# Altium footprint library shared_lib.PcbLib: 65 footprints (part 1 of 5)
Each footprint in its own frame and in the unit in brackets; x right, y up, seen from the top. Pads: shape width x height; smd on the part's side, far side on the other; paste and mask are expansions set on the pad; w line width, h text height; cw(c..) or ccw(c..) is an arc to the next point about the centre after c.
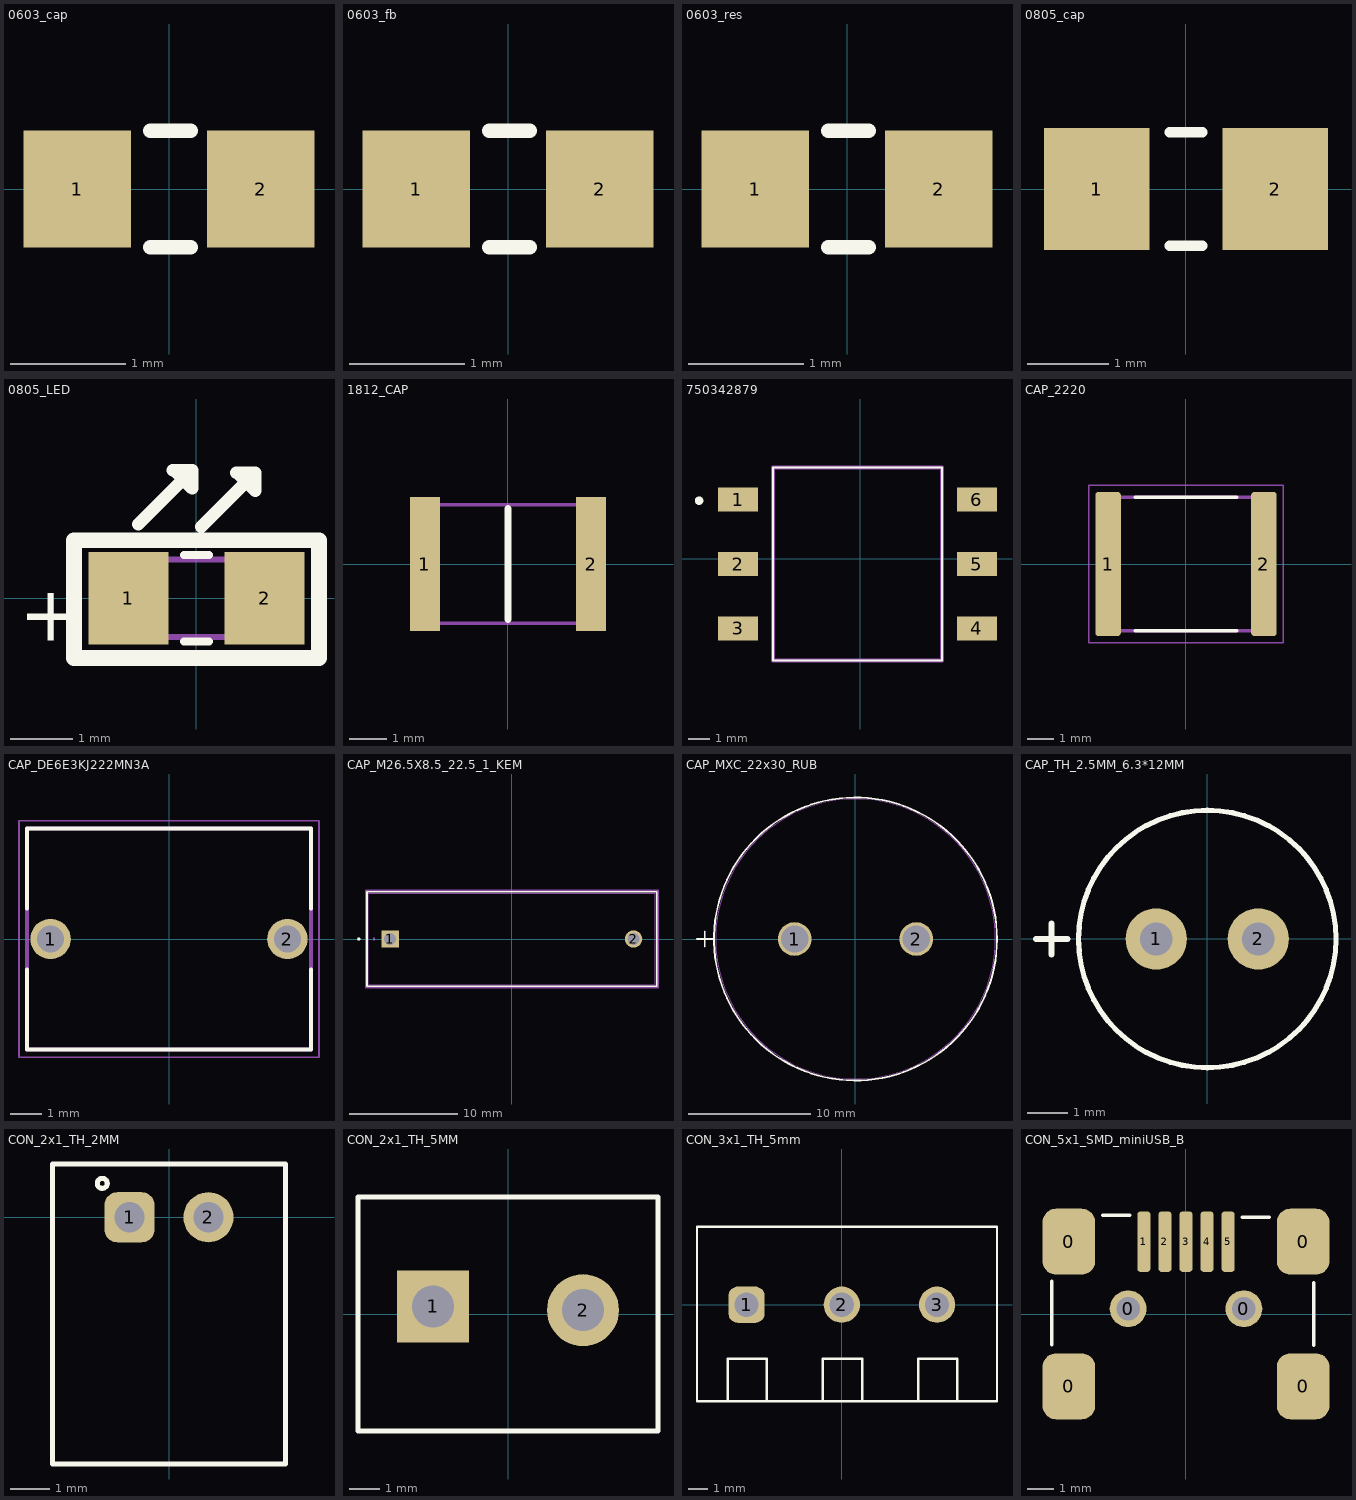
[diagram p0: the footprints below, top view; thin cyan lines are the x and y axes]

## 0603_cap [mil]
pads (2):
  rect 37x40 smd: 1(-31.5,0) 2(31.5,0)
Top Overlay:
  lines w5: -6.5,-20 7.5,-20 ; -6.5,20 7.5,20
3D body "CircuitWorks-CAPACITOR 0603.STEP": height 34.36, standoff 0.5, extent -31.5,-16.93 31.5,16.93

## 0603_fb [mil]
pads (2):
  rect 37x40 smd: 1(-31.5,0) 2(31.5,0)
Top Overlay:
  lines w5: -6.5,-20 7.5,-20 ; -6.5,20 7.5,20
3D body "742792602.stp": height 32, standoff 0.5, extent -31.5,-15.75 31.49,15.75

## 0603_res [mil] "1608 Metric / 20190225 / C-A.Serna.A"
pads (2):
  rect 37x40 smd: 1(-31.5,0) 2(31.5,0)
Top Overlay:
  lines w5: -6.5,-20 7.5,-20 ; -6.5,20 7.5,20
3D body "C0603.step": height 11.89, standoff 0, extent -31.5,-15.75 31.5,15.75

## 0805_cap [mm]
pads (2):
  rect 1.3x1.5 smd: 1(-1.1,0) 2(1.1,0)
Top Overlay:
  lines w0.127: -0.2,-0.7 0.2,-0.7 ; -0.2,0.7 0.2,0.7
3D body: height 1, standoff 0, extent -1.125,-0.7 1.075,0.7

## 0805_LED [mm]
pads (2):
  rect 1.3x1.5 smd: 1(-1.1,0) 2(1.1,0)
Top Overlay:
  lines w0.127: -0.2,-0.7 0.2,-0.7 ; -0.2,0.7 0.2,0.7
  lines w0.203: -0.941,1.197 -0.306,1.832 ; -0.38,2.072 -0.069,2.072 -0.069,1.775 -0.366,2.072 ; 0.079,1.157 0.714,1.792 ; 0.64,2.032 0.951,2.032 0.951,1.735 0.654,2.032
  lines w0.254: -1.981,-0.965 1.981,-0.965 1.981,0.94 -1.981,0.94 -1.981,-0.965
  text "+" at -2.87,-0.686 h0.89
Mechanical 1:
  lines w0.1: -0.7,-0.625 -0.7,0.625 ; 0.7,-0.625 0.7,0.625 ; -1,-0.625 1,-0.625 1,0.625 -1,0.625 -1,-0.625
3D body: height 1.1, standoff 0.5, extent -0.7,-0.625 0.7,0.625
3D body: height 0.5, standoff 0, extent -1,-0.625 1,0.625

## 1812_CAP [mm]
pads (2):
  rect 0.81x3.61 smd: 1(-2.25,0) 2(2.25,0)
Top Overlay:
  lines w0.2: 0,-1.5 0,1.5
Mechanical 15:
  lines w0.1: -2.25,-1.6 2.25,-1.6 2.25,1.6 -2.25,1.6 -2.25,-1.6
3D body "CGA8N4X7T2W474K230KA.stp": height 2.77, standoff 0.03, extent -2.105,-1.618 1.995,1.518

## 750342879 [mm]
pads (6):
  rect 1.9x1.14 smd: 1(-5.782,2.796) 2(-5.782,-0.254) 3(-5.782,-3.304) 4(5.528,-3.304) 5(5.528,-0.254) 6(5.528,2.796)
Top Overlay:
  lines w0.1: -4.127,-4.824 3.873,-4.824 3.873,4.316 -4.127,4.316 -4.127,-4.824
  lines w0.2: -7.727,2.746 ccw(c-7.627,2.746) -7.527,2.746 ccw(c-7.627,2.746) -7.727,2.746
Mechanical 15:
  lines w0.2: -4.127,-4.824 3.873,-4.824 3.873,4.316 -4.127,4.316 -4.127,-4.824
3D body "750342879.stp": height 7.31, standoff 0, extent -6.127,-4.699 5.873,4.191

## CAP_2220 [mm]
pads (2):
  rrect25% 0.96x5.41 smd paste+0 mask+0.102: 1(-2.925,0) 2(2.925,0)
Top Overlay:
  lines w0.127: -1.905,-2.5 1.905,-2.5 ; -1.905,2.5 1.905,2.5
Mechanical 13:
  lines w0.127: -2.85,-2.5 -2.85,2.5 2.85,2.5 2.85,-2.5 -2.85,-2.5
Mechanical 15:
  lines w0.05: -3.655,-2.955 -3.655,2.955 3.655,2.955 3.655,-2.955 -3.655,-2.955
3D body "step_temp.STEP": height 2.8, standoff 0, extent -2.85,-2.5 2.85,2.5

## CAP_DE6E3KJ222MN3A [mm]
pads (2):
  round 1.28 hole 0.85: 1(-3.75,0) 2(3.75,0)
Top Overlay:
  lines w0.127: -4.5,-0.96 -4.5,-3.5 4.5,-3.5 4.5,-0.96 ; -4.5,0.96 -4.5,3.5 4.5,3.5 4.5,0.96
Mechanical 13:
  lines w0.127: -4.5,-3.5 -4.5,3.5 4.5,3.5 4.5,-3.5 -4.5,-3.5
Mechanical 15:
  lines w0.05: -4.75,-3.75 4.75,-3.75 4.75,3.75 -4.75,3.75 -4.75,-3.75
3D body "step_temp.STEP": height 12, standoff -25, extent -4.5,-3.5 4.5,3.5

## CAP_M26.5X8.5_22.5_1_KEM [mil]
pads (2):
  rect 63x63 hole 43 paste-99999 mask+0: 1(-442.91,0)
  round 63 hole 43 paste-99999 mask+0: 2(442.91,0)
Top Overlay:
  circle w6: c-556.65,0 r3
  lines w6: -526.65,-172.32 526.65,-172.32 526.65,172.32 -526.65,172.32 -526.65,-172.32
Mechanical 13:
  circle w1: c-501.65,0 r3
  lines w1: -521.65,-167.32 521.65,-167.32 521.65,167.32 -521.65,167.32 -521.65,-167.32
Mechanical 15:
  lines w6: -531.65,-177.32 -531.65,177.32 531.65,177.32 531.65,-177.32 -531.65,-177.32
3D body "CAP_M265X85_225_1_KEM.step": height 589.29, standoff -199.02, extent -521.65,-167.32 521.65,167.32

## CAP_MXC_22x30_RUB [mil]
pads (2):
  round 109 hole 89 paste-99999 mask+0: 1(-196.85,0) 2(196.85,0)
Top Overlay:
  circle w6: c0,0 r458
  lines w6: -513,0 -463,0 ; -488,-25 -488,25
Mechanical 13:
  circle w1: c0,0 r453
  lines w1: -513,0 -463,0 ; -488,-25 -488,25
3D body "CAP_MXC_22x30_RUB.step": height 1260.63, standoff -337.01, extent -452.99,-452.8 454.39,452.8

## CAP_TH_2.5MM_6.3*12MM [mm]
pads (2):
  round 1.5 hole 0.8: 1(-1.25,0) 2(1.25,0)
Top Overlay:
  circle w0.127: c0,0 r3.15
  lines w0.152: -4.191,0 -3.429,0 ; -3.81,-0.381 -3.81,0.381
3D body: height 12, standoff 0, extent -3.15,-3.15 3.15,3.15

## CON_2x1_TH_2MM [mm] "/20190307/N-A.Potosi"
pads (2):
  rrect50% 1.27x1.27 hole 0.762: 1(-1,0)
  round 1.27 hole 0.762: 2(1,0)
Top Overlay:
  circle w0.127: c-1.69,0.86 r0.127
  lines w0.127: -2.95,-6.25 -2.95,1.35 2.95,1.35 2.95,-6.25 -2.95,-6.25
3D body "S2B-PH-K-S(LF)(SN)--3DModel-STEP-56544.STEP": height 4.8, standoff -3.38, extent -2.96,-6.27 2.94,1.33

## CON_2x1_TH_5MM [mm]
pads (2):
  rect 2.4x2.4 hole 1.4: 1(-2.5,0.254)
  round 2.4 hole 1.4: 2(2.5,0.127)
Top Overlay:
  lines w0.152: -5,-3.9 -5,3.9 5,3.9 5,-3.9 -5,-3.9
3D body: height 10.2, standoff 0, extent -5,-3.9 5,3.9

## CON_3x1_TH_5mm [mm]
height 12
pads (3):
  rrect50% 1.9x1.9 hole 1.27: 1(-5,0)
  round 1.9 hole 1.27: 2(0,0) 3(5,0)
Top Overlay:
  lines w0.127: -5.99,-5.08 -5.99,-2.83 -3.93,-2.83 -3.93,-5.08 ; -0.99,-5.08 -0.99,-2.83 1.07,-2.83 1.07,-5.077 ; 4.01,-5.08 4.01,-2.83 6.07,-2.83 6.07,-5.08 ; -7.603,-5.08 -7.603,4.102 8.148,4.102 8.148,-5.08 -7.603,-5.08
3D body "pxc_1935174_03_PT-1-5-3-5-0-H_3D.stp": height 11.7, standoff -3.2, extent -7.507,-4.988 8.063,4.012

## CON_5x1_SMD_miniUSB_B [mm]
pads (11):
  rrect50% 2x2.5 smd: 0(-4.45,-2.75) 0(-4.45,2.75) 0(4.45,-2.75) 0(4.45,2.75)
  round 1.4 hole 0.889: 0(-2.2,0.2) 0(2.2,0.2)
  rrect50% 0.5x2.3 smd: 1(-1.6,2.75) 2(-0.8,2.75) 3(0,2.75) 4(0.8,2.75) 5(1.6,2.75)
Top Overlay:
  lines w0.127: -5.105,-1.172 -5.105,1.241 ; -3.175,3.756 -2.134,3.756 ; 2.134,3.68 3.175,3.68 ; 4.851,-1.197 4.851,1.191
3D body "usb_a-usb_b-m5-smd-c.stp": height 4, standoff -0.93, extent -5.102,-5.596 4.798,3.654